# Altium footprint library Task with ESP32.PcbLib: 78 footprints (part 4 of 5)
Each footprint in its own frame and in the unit in brackets; x right, y up, seen from the top. Pads: shape width x height; smd on the part's side, far side on the other; paste and mask are expansions set on the pad; w line width, h text height; cw(c..) or ccw(c..) is an arc to the next point about the centre after c.
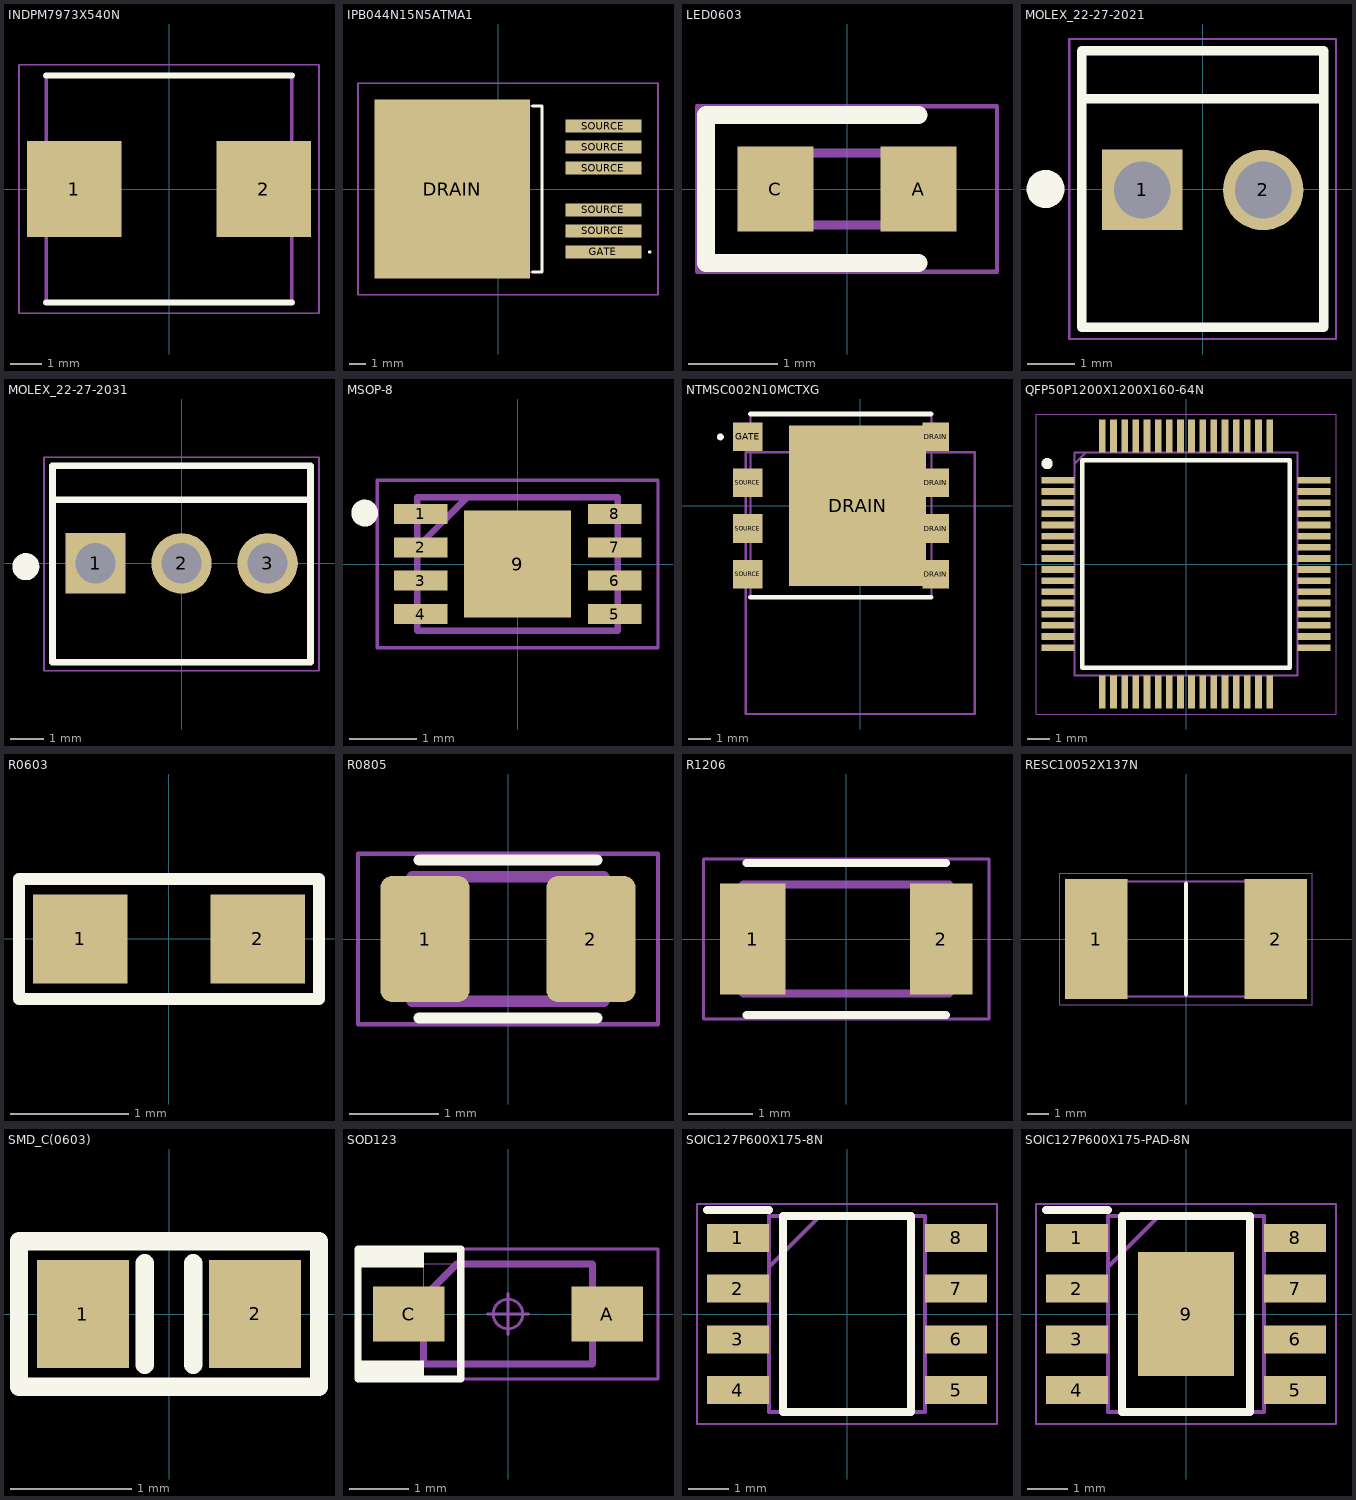
[diagram p3: the footprints below, top view; thin cyan lines are the x and y axes]

## INDPM7973X540N [mm]
pads (2):
  rect 3.05x3.1 smd: 1(-3.05,0) 2(3.05,0)
Top Overlay:
  lines w0.2: -3.95,-3.65 3.95,-3.65 ; -3.95,3.65 3.95,3.65
Mechanical 15:
  lines w0.1: -3.95,-3.65 3.95,-3.65 3.95,3.65 -3.95,3.65 -3.95,-3.65
Mechanical 20:
  lines w0.05: -4.825,-4 4.825,-4 4.825,4 -4.825,4 -4.825,-4
3D body "SRP7050WA-220M.stp": height 5.4, standoff 0, extent -3.95,-3.65 3.95,3.65

## IPB044N15N5ATMA1 [mm]
pads (7):
  rect 9.4x10.8 smd: DRAIN(-2.8,0)
  rect 4.6x0.8 smd: GATE(6.35,-3.81) SOURCE(6.35,-2.54) SOURCE(6.35,-1.27) SOURCE(6.35,1.27) SOURCE(6.35,2.54) SOURCE(6.35,3.81)
Top Overlay:
  lines w0.1: 9.1,-3.81 cw(c9.15,-3.81) 9.2,-3.81 cw(c9.15,-3.81) 9.1,-3.81
  lines w0.2: 2.067,-5.027 2.63,-5.027 2.63,5.027 2.067,5.027
Mechanical 15:
  lines w0.1: -6.35,-5.027 2.63,-5.027 2.63,5.027 -6.35,5.027 -6.35,-5.027
Mechanical 20:
  lines w0.1: -8.5,-6.4 9.65,-6.4 9.65,6.4 -8.5,6.4 -8.5,-6.4
3D body "IPB044N15N5ATMA1.stp": height 4.5, standoff 0, extent -6.768,-5 8.267,5

## LED0603 [mm]
pads (2):
  rect 0.85x0.95 smd: A(0.8,0) C(-0.8,0)
Top Overlay:
  lines w0.2: 0.8,-0.825 -1.575,-0.825 -1.575,0.825 0.8,0.825
Mechanical 15:
  lines w0.1: -0.8,0.133 -0.533,0.4 ; -0.8,-0.4 0.8,-0.4 0.8,0.4 -0.8,0.4 -0.8,-0.4
Mechanical 20:
  lines w0.05: -1.675,-0.925 1.675,-0.925 1.675,0.925 -1.675,0.925 -1.675,-0.925
3D body "SML-D12U1WT86.stp": height 0.54, standoff -0.02, extent -0.8,-0.4 0.8,0.4

## MOLEX_22-27-2021 [mm]
height 13.5
pads (2):
  rect 1.69x1.69 / inner round 1.69 / far side rect 1.69x1.69 hole 1.19: 1(-1.27,-0.02)
  round 1.69 hole 1.19: 2(1.27,-0.02)
Top Overlay:
  circle w0.4: c-3.302,0 r0.2
  lines w0.2: -2.54,1.9 2.54,1.9 ; -2.54,-2.9 -2.54,-1.9 -2.54,2.9 2.54,2.9 2.54,-1.9 2.54,-2.9 -2.54,-2.9
Mechanical 15:
  lines w0.05: -2.8,-3.15 2.8,-3.15 2.8,3.15 -2.8,3.15 -2.8,-3.15
3D body "22-27-2021.stp": height 12.12, standoff -3.14, extent -2.54,-2.92 2.54,2.88

## MOLEX_22-27-2031 [mm]
height 13.5
pads (3):
  rect 1.785x1.785 hole 1.19: 1(-2.54,0)
  round 1.785 hole 1.19: 2(0,0) 3(2.54,0)
Top Overlay:
  circle w0.4: c-4.6,-0.1 r0.2
  lines w0.2: -3.81,1.88 3.81,1.88 ; -3.81,-2.92 -3.81,2.88 3.81,2.88 3.81,-2.92 -3.81,-2.92
Mechanical 15:
  lines w0.05: -4.06,-3.17 4.06,-3.17 4.06,3.13 -4.06,3.13 -4.06,-3.17
3D body "22-27-2031.stp": height 12.12, standoff -3.14, extent -3.81,-2.921 3.81,2.879

## MSOP-8 [mm]
pads (9):
  rect 0.8x0.3 smd: 1(-1.45,0.75) 2(-1.45,0.25) 3(-1.45,-0.25) 4(-1.45,-0.75) 5(1.45,-0.75) 6(1.45,-0.25) 7(1.45,0.25) 8(1.45,0.75)
  rect 1.6x1.6 smd: 9(0,0)
Top Overlay:
  circle w0.2: c-2.286,0.762 r0.1
Mechanical 15:
  lines w0.1: -1.5,0.25 -0.75,1 ; -1.5,-1 -1.5,1 1.5,1 1.5,-1 -1.5,-1
Mechanical 20:
  lines w0.05: -2.1,-1.25 -2.1,1.25 2.1,1.25 2.1,-1.25 -2.1,-1.25
3D body "MCP16311T-E_MNY.stp": height 0.8, standoff 0, extent -1.55,-1 1.55,1

## NTMSC002N10MCTXG [mm]
pads (9):
  rect 6x7 smd: DRAIN(-0.12,0)
  rect 1.15x1.25 smd: DRAIN(3.295,-3) DRAIN(3.295,-1) DRAIN(3.295,1) DRAIN(3.295,3)
  rect 1.28x1.25 smd: GATE(-4.915,3) SOURCE(-4.915,-3) SOURCE(-4.915,-1) SOURCE(-4.915,1)
Top Overlay:
  lines w0.2: -6.158,3 ccw(c-6.108,3) -6.058,3 ; -6.158,3 cw(c-6.108,3) -6.058,3 ; -6.158,3 ccw(c-6.108,3) -6.058,3 ; -4.795,-4 3.105,-4 -4.795,-4 ; -4.795,4 3.105,4 -4.795,4
Mechanical 15:
  lines w0.1: -4.795,-4 3.105,-4 3.105,4 -4.795,4 -4.795,-4
Mechanical 20:
  lines w0.1: -5,-9.095 -5,2.325 5,2.325 5,-9.095 -5,-9.095
3D body "NTMTSC002N10MCTXG.stp": height 1.02, standoff 0, extent -5.025,-4.15 3.374,4.15

## QFP50P1200X1200X160-64N [mm]
pads (64):
  rect 1.475x0.3 smd: 1(-5.738,3.75) 2(-5.738,3.25) 3(-5.738,2.75) 4(-5.738,2.25) 5(-5.738,1.75) 6(-5.738,1.25) 7(-5.738,0.75) 8(-5.738,0.25) 9(-5.738,-0.25) 10(-5.738,-0.75) 11(-5.738,-1.25) 12(-5.738,-1.75) 13(-5.738,-2.25) 14(-5.738,-2.75) 15(-5.738,-3.25) 16(-5.738,-3.75) 33(5.738,-3.75) 34(5.738,-3.25) 35(5.738,-2.75) 36(5.738,-2.25) 37(5.738,-1.75) 38(5.738,-1.25) 39(5.738,-0.75) 40(5.738,-0.25) 41(5.738,0.25) 42(5.738,0.75) 43(5.738,1.25) 44(5.738,1.75) 45(5.738,2.25) 46(5.738,2.75) 47(5.738,3.25) 48(5.738,3.75)
  rect 0.3x1.475 smd: 17(-3.75,-5.738) 18(-3.25,-5.738) 19(-2.75,-5.738) 20(-2.25,-5.738) 21(-1.75,-5.738) 22(-1.25,-5.738) 23(-0.75,-5.738) 24(-0.25,-5.738) 25(0.25,-5.738) 26(0.75,-5.738) 27(1.25,-5.738) 28(1.75,-5.738) 29(2.25,-5.738) 30(2.75,-5.738) 31(3.25,-5.738) 32(3.75,-5.738) 49(3.75,5.738) 50(3.25,5.738) 51(2.75,5.738) 52(2.25,5.738) 53(1.75,5.738) 54(1.25,5.738) 55(0.75,5.738) 56(0.25,5.738) 57(-0.25,5.738) 58(-0.75,5.738) 59(-1.25,5.738) 60(-1.75,5.738) 61(-2.25,5.738) 62(-2.75,5.738) 63(-3.25,5.738) 64(-3.75,5.738)
Top Overlay:
  circle w0.25: c-6.225,4.5 r0.125
  lines w0.2: -4.65,-4.65 4.65,-4.65 4.65,4.65 -4.65,4.65 -4.65,-4.65
Mechanical 15:
  lines w0.1: -5,4.5 -4.5,5 ; -5,-5 5,-5 5,5 -5,5 -5,-5
Mechanical 20:
  lines w0.05: -6.725,-6.725 6.725,-6.725 6.725,6.725 -6.725,6.725 -6.725,-6.725
3D body "STM32F405RGT6TR.stp": height 1.6, standoff 0, extent -6,-6 6,6

## R0603 [mm] "RESISTOR SMD 0603"
height 0.45
pads (2):
  rect 0.8x0.75 smd: 1(-0.75,0) 2(0.75,0)
Top Overlay:
  lines w0.1: -1.27,-0.508 -1.27,0.508 1.27,0.508 1.27,-0.508 -1.27,-0.508
3D body "User Library-0603(1608M) Res.STEP": height 0.79, standoff 0, extent -1,-0.394 1,0.394

## R0805 [mm]
pads (2):
  rrect25% 1x1.42 smd: 1(-0.935,0) 2(0.935,0)
Top Overlay:
  lines w0.127: -1,-0.89 1,-0.89 ; -1,0.89 1,0.89
Mechanical 13:
  lines w0.127: -1.08,-0.7 -1.08,0.7 1.08,0.7 1.08,-0.7 -1.08,-0.7
Mechanical 15:
  lines w0.05: -1.69,-0.96 -1.69,0.96 1.69,0.96 1.69,-0.96 -1.69,-0.96

## R1206 [mm]
height 1.1
pads (2):
  rect 1.02x1.73 smd: 1(-1.455,0)
  rect 0.97x1.73 smd: 2(1.48,0)
Top Overlay:
  lines w0.127: -1.55,-1.18 1.55,-1.18 ; -1.55,1.18 1.55,1.18
Mechanical 13:
  lines w0.127: -1.6,-0.85 -1.6,0.85 1.6,0.85 1.6,-0.85 -1.6,-0.85
Mechanical 15:
  lines w0.05: -2.22,-1.244 -2.22,1.244 2.22,1.244 2.22,-1.244 -2.22,-1.244
3D body "ERJ-8GEY0R00V.STEP": height 0.7, standoff 0, extent -1.6,-0.8 1.6,0.8

## RESC10052X137N [mm]
pads (2):
  rect 2.85x5.5 smd: 1(-4.1,0) 2(4.1,0)
Top Overlay:
  lines w0.2: 0,-2.525 0,2.525
Mechanical 15:
  lines w0.1: -5,-2.625 -5,2.625 5,2.625 5,-2.625 -5,-2.625
Mechanical 20:
  lines w0.05: -5.775,-3 -5.775,3 5.775,3 5.775,-3 -5.775,-3
3D body "CSS2H-3920R-L500FE.stp": height 1.37, standoff 0, extent -5,-2.625 5,2.625

## SMD_C(0603) [mil]
pads (2):
  rect 30x35 smd mask+2: 1(-28,0) 2(28,0)
Top Overlay:
  lines w6: -7.87,-16.54 -7.87,16.54 ; 7.87,-16.54 7.87,16.54 ; -48.82,-23.62 -48.82,23.62 48.82,23.62 48.82,-23.62 -48.82,-23.62
3D body "User Library-CapCeramic_Kemet_0603_1608.step": height 31.5, standoff 0, extent -31.49,-15.74 31.5,15.75

## SOD123 [mm]
height 1.35
pads (2):
  rect 1.21x0.93 smd: A(1.68,0) C(-1.68,0)
Top Overlay:
  rectangle: -2.54,-1.1 -1.425,-0.787
  rectangle: -2.54,0.787 -1.425,1.1
  lines w0.12: -2.54,-1.1 -2.54,1.1 -0.8,1.1 -0.8,-1.1 -2.54,-1.1
Mechanical 13:
  lines w0.001: -1.425,-0.85 -1.425,0.85 1.425,0.85 1.425,-0.85 -1.425,-0.85
  lines w0.12: -1.43,-0.85 -1.43,0.283 -0.863,0.85 1.43,0.85 1.43,-0.85 -1.43,-0.85
Mechanical 15:
  circle w0.05: c0,0 r0.25
  lines w0.05: -0.35,0 0.35,0 ; 0,-0.35 0,0.35 ; -2.54,-1.1 2.54,-1.1 2.54,1.1 -2.54,1.1 -2.54,-1.1
3D body "CircuitWorks-SOD123.STEP": height 1.27, standoff 0, extent -1.85,-0.8 1.85,0.8

## SOIC127P600X175-8N [mm]
pads (8):
  rect 1.55x0.7 smd: 1(-2.725,1.905) 2(-2.725,0.635) 3(-2.725,-0.635) 4(-2.725,-1.905) 5(2.725,-1.905) 6(2.725,-0.635) 7(2.725,0.635) 8(2.725,1.905)
Top Overlay:
  lines w0.2: -3.5,2.605 -1.95,2.605 ; -1.6,-2.45 -1.6,2.45 1.6,2.45 1.6,-2.45 -1.6,-2.45
Mechanical 15:
  lines w0.1: -1.95,1.18 -0.68,2.45 ; -1.95,-2.45 -1.95,2.45 1.95,2.45 1.95,-2.45 -1.95,-2.45
Mechanical 20:
  lines w0.05: -3.75,-2.75 -3.75,2.75 3.75,2.75 3.75,-2.75 -3.75,-2.75
3D body "TJA1051T_3_CM,118.stp": height 1.75, standoff 0, extent -3,-2.45 3,2.45

## SOIC127P600X175-PAD-8N [mm]
pads (9):
  rect 1.55x0.7 smd: 1(-2.725,1.905) 2(-2.725,0.635) 3(-2.725,-0.635) 4(-2.725,-1.905) 5(2.725,-1.905) 6(2.725,-0.635) 7(2.725,0.635) 8(2.725,1.905)
  rect 2.4x3.1 smd: 9(0,0)
Top Overlay:
  lines w0.2: -3.5,2.605 -1.95,2.605 ; -1.6,-2.45 -1.6,2.45 1.6,2.45 1.6,-2.45 -1.6,-2.45
Mechanical 15:
  lines w0.1: -1.95,1.18 -0.68,2.45 ; -1.95,-2.45 -1.95,2.45 1.95,2.45 1.95,-2.45 -1.95,-2.45
Mechanical 20:
  lines w0.05: -3.75,-2.75 -3.75,2.75 3.75,2.75 3.75,-2.75 -3.75,-2.75
3D body "TJA1051T_3_CM,118.stp": height 1.75, standoff 0, extent -3,-2.45 3,2.45